# Altium footprint library ICs_imp.PCBLIB: 118 footprints (part 4 of 8)
Each footprint in its own frame and in the unit in brackets; x right, y up, seen from the top. Pads: shape width x height; smd on the part's side, far side on the other; paste and mask are expansions set on the pad; w line width, h text height; cw(c..) or ccw(c..) is an arc to the next point about the centre after c.
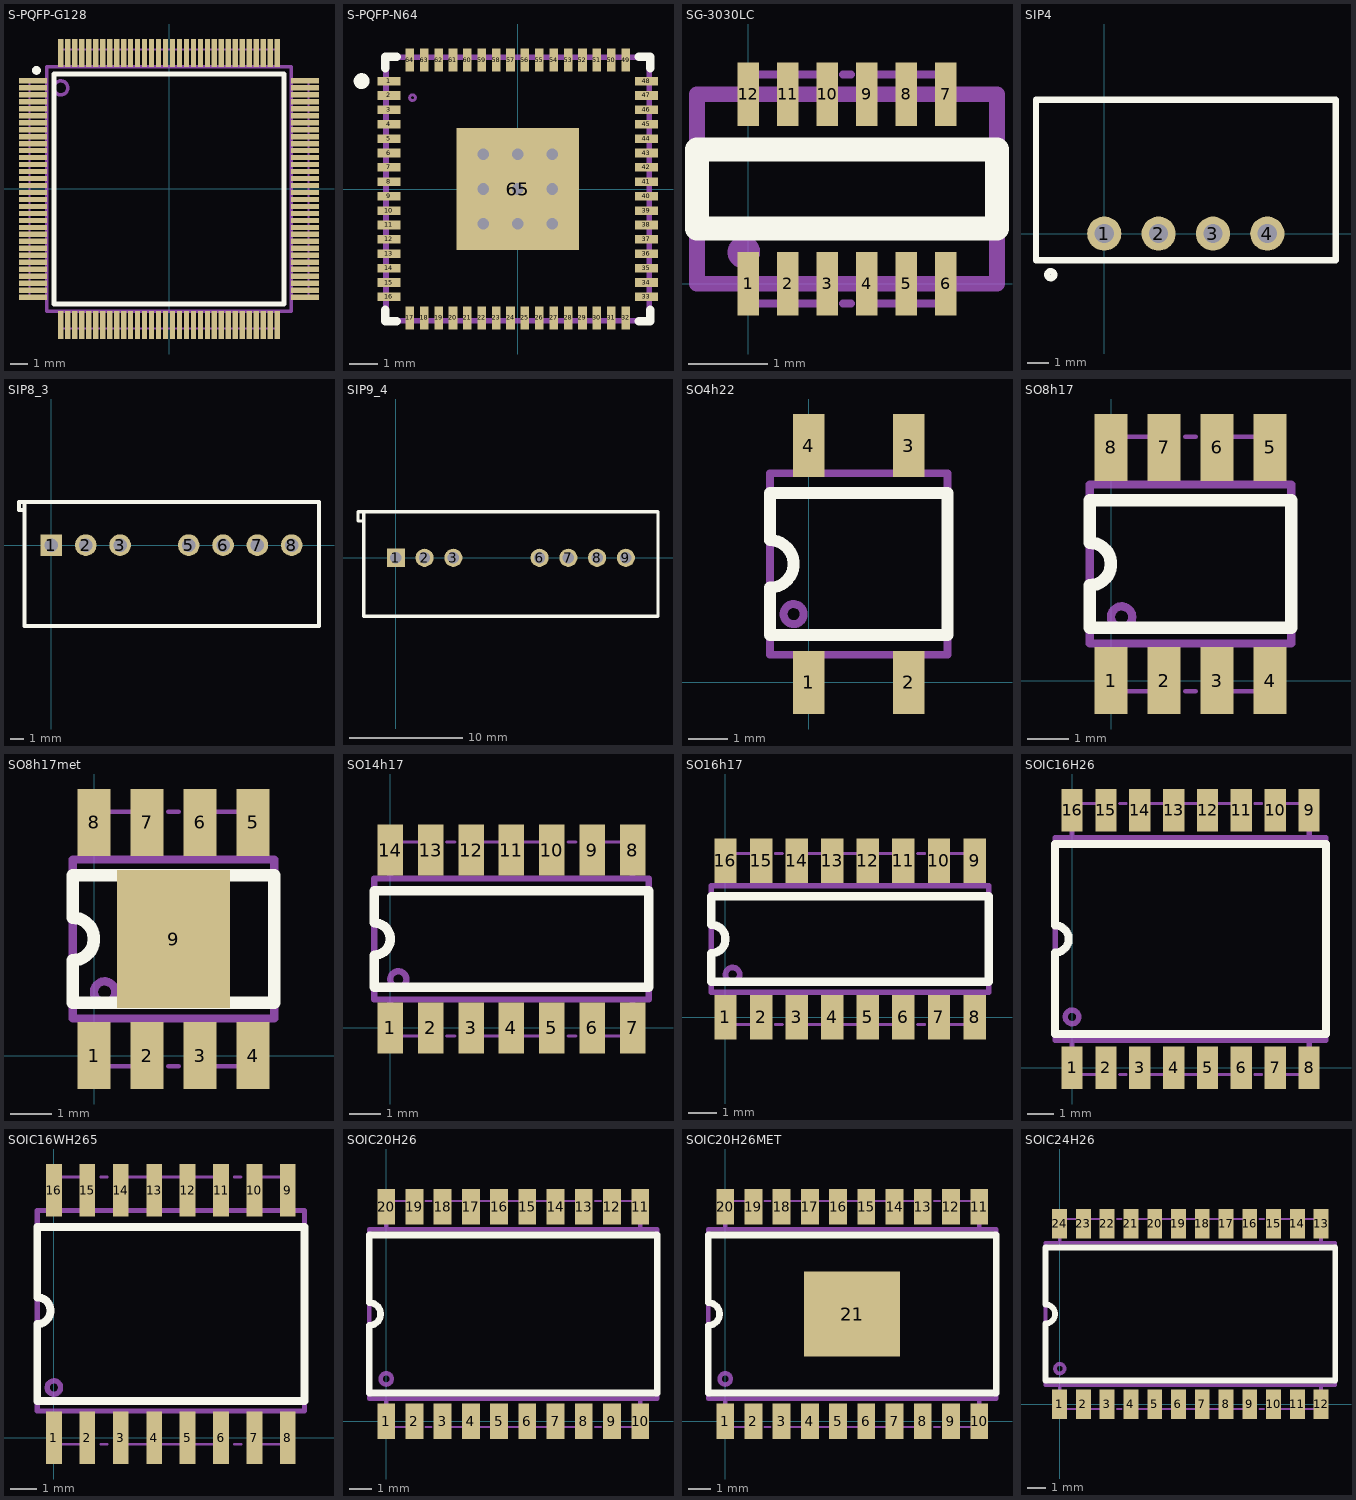
[diagram p3: the footprints below, top view; thin cyan lines are the x and y axes]

## S-PQFP-G128 [mm]
height 1.45
pads (128):
  rect 1.6x0.3 smd: 1(-7.8,6.2) 2(-7.8,5.8) 3(-7.8,5.4) 4(-7.8,5) 5(-7.8,4.6) 6(-7.8,4.2) 7(-7.8,3.8) 8(-7.8,3.4) 9(-7.8,3) 10(-7.8,2.6) 11(-7.8,2.2) 12(-7.8,1.8) 13(-7.8,1.4) 14(-7.8,1) 15(-7.8,0.6) 16(-7.8,0.2) 17(-7.8,-0.2) 18(-7.8,-0.6) 19(-7.8,-1) 20(-7.8,-1.4) 21(-7.8,-1.8) 22(-7.8,-2.2) 23(-7.8,-2.6) 24(-7.8,-3) 25(-7.8,-3.4) 26(-7.8,-3.8) 27(-7.8,-4.2) 28(-7.8,-4.6) 29(-7.8,-5) 30(-7.8,-5.4) 31(-7.8,-5.8) 32(-7.8,-6.2) 65(7.8,-6.2) 66(7.8,-5.8) 67(7.8,-5.4) 68(7.8,-5) 69(7.8,-4.6) 70(7.8,-4.2) 71(7.8,-3.8) 72(7.8,-3.4) 73(7.8,-3) 74(7.8,-2.6) 75(7.8,-2.2) 76(7.8,-1.8) 77(7.8,-1.4) 78(7.8,-1) 79(7.8,-0.6) 80(7.8,-0.2) 81(7.8,0.2) 82(7.8,0.6) 83(7.8,1) 84(7.8,1.4) 85(7.8,1.8) 86(7.8,2.2) 87(7.8,2.6) 88(7.8,3) 89(7.8,3.4) 90(7.8,3.8) 91(7.8,4.2) 92(7.8,4.6) 93(7.8,5) 94(7.8,5.4) 95(7.8,5.8) 96(7.8,6.2)
  rect 0.3x1.6 smd: 33(-6.2,-7.8) 34(-5.8,-7.8) 35(-5.4,-7.8) 36(-5,-7.8) 37(-4.6,-7.8) 38(-4.2,-7.8) 39(-3.8,-7.8) 40(-3.4,-7.8) 41(-3,-7.8) 42(-2.6,-7.8) 43(-2.2,-7.8) 44(-1.8,-7.8) 45(-1.4,-7.8) 46(-1,-7.8) 47(-0.6,-7.8) 48(-0.2,-7.8) 49(0.2,-7.8) 50(0.6,-7.8) 51(1,-7.8) 52(1.4,-7.8) 53(1.8,-7.8) 54(2.2,-7.8) 55(2.6,-7.8) 56(3,-7.8) 57(3.4,-7.8) 58(3.8,-7.8) 59(4.2,-7.8) 60(4.6,-7.8) 61(5,-7.8) 62(5.4,-7.8) 63(5.8,-7.8) 64(6.2,-7.8) 97(6.2,7.8) 98(5.8,7.8) 99(5.4,7.8) 100(5,7.8) 101(4.6,7.8) 102(4.2,7.8) 103(3.8,7.8) 104(3.4,7.8) 105(3,7.8) 106(2.6,7.8) 107(2.2,7.8) 108(1.8,7.8) 109(1.4,7.8) 110(1,7.8) 111(0.6,7.8) 112(0.2,7.8) 113(-0.2,7.8) 114(-0.6,7.8) 115(-1,7.8) 116(-1.4,7.8) 117(-1.8,7.8) 118(-2.2,7.8) 119(-2.6,7.8) 120(-3,7.8) 121(-3.4,7.8) 122(-3.8,7.8) 123(-4.2,7.8) 124(-4.6,7.8) 125(-5,7.8) 126(-5.4,7.8) 127(-5.8,7.8) 128(-6.2,7.8)
Top Overlay:
  circle w0.3: c-7.6,6.8 r0.1
  lines w0.3: -6.6,-6.6 6.6,-6.6 6.6,6.6 -6.6,6.6 -6.6,-6.6
Mechanical 1:
  circle w0.2: c-6.2,5.8 r0.4
  lines w0.1: -7,-6.2 -8,-6.2 -8,6.2 -7,6.2 ; -6.2,-7 -6.2,-8 6.2,-8 6.2,-7 ; -6.2,7 -6.2,8 6.2,8 6.2,7 ; 7,-6.2 8,-6.2 8,6.2 7,6.2
  lines w0.2: -7,-7 7,-7 7,7 -7,7 -7,-7
  text ".Designator" at -1.11,0.28 h1.5
  text ".Comment" at -2.7,-1.42 h1.5
  text "128" at -5.1,5.2 h1.5
3D body "S-PQFP-G128h1_45.stp": height 1.47, standoff 0, extent -8,-8 8,8

## S-PQFP-N64 [mm] "QFN, 64-Leads, Body 9.1x9.1mm (max), Pitch 0.50mm, IPC Medium Density"
height 1
pads (65):
  rect 0.8x0.3 smd: 1(-4.475,3.75) 2(-4.475,3.25) 3(-4.475,2.75) 4(-4.475,2.25) 5(-4.475,1.75) 6(-4.475,1.25) 7(-4.475,0.75) 8(-4.475,0.25) 9(-4.475,-0.25) 10(-4.475,-0.75) 11(-4.475,-1.25) 12(-4.475,-1.75) 13(-4.475,-2.25) 14(-4.475,-2.75) 15(-4.475,-3.25) 16(-4.475,-3.75) 33(4.475,-3.75) 34(4.475,-3.25) 35(4.475,-2.75) 36(4.475,-2.25) 37(4.475,-1.75) 38(4.475,-1.25) 39(4.475,-0.75) 40(4.475,-0.25) 41(4.475,0.25) 42(4.475,0.75) 43(4.475,1.25) 44(4.475,1.75) 45(4.475,2.25) 46(4.475,2.75) 47(4.475,3.25) 48(4.475,3.75)
  rect 0.3x0.8 smd: 17(-3.75,-4.475) 18(-3.25,-4.475) 19(-2.75,-4.475) 20(-2.25,-4.475) 21(-1.75,-4.475) 22(-1.25,-4.475) 23(-0.75,-4.475) 24(-0.25,-4.475) 25(0.25,-4.475) 26(0.75,-4.475) 27(1.25,-4.475) 28(1.75,-4.475) 29(2.25,-4.475) 30(2.75,-4.475) 31(3.25,-4.475) 32(3.75,-4.475) 49(3.75,4.475) 50(3.25,4.475) 51(2.75,4.475) 52(2.25,4.475) 53(1.75,4.475) 54(1.25,4.475) 55(0.75,4.475) 56(0.25,4.475) 57(-0.25,4.475) 58(-0.75,4.475) 59(-1.25,4.475) 60(-1.75,4.475) 61(-2.25,4.475) 62(-2.75,4.475) 63(-3.25,4.475) 64(-3.75,4.475)
  rect 4.25x4.25 smd: 65(0,0)
via 1.2,-1.2 diameter 0.8 hole 0.4
via 0,-1.2 diameter 0.8 hole 0.4
via -1.2,-1.2 diameter 0.8 hole 0.4
via 1.2,0 diameter 0.8 hole 0.4
via 0,0 diameter 0.8 hole 0.4
via -1.2,0 diameter 0.8 hole 0.4
via 1.2,1.2 diameter 0.8 hole 0.4
via 0,1.2 diameter 0.8 hole 0.4
via -1.2,1.2 diameter 0.8 hole 0.4
Top Overlay:
  circle w0.3: c-5.425,3.75 r0.125
  lines w0.3: -4.6,-4.2 -4.6,-4.6 -4.2,-4.6 ; -4.6,4.2 -4.6,4.6 -4.2,4.6 ; 4.2,-4.6 4.6,-4.6 4.6,-4.2 ; 4.2,4.6 4.6,4.6 4.6,4.2
Mechanical 1:
  circle w0.1: c-3.656,3.175 r0.1
  lines w0.2: -4.575,-4.575 4.575,-4.575 4.575,4.575 -4.575,4.575 -4.575,-4.575
  text "64" at -3.429,3.429 h1.5
  text ".Comment" at -2.88,-1.15 h1.5
  text ".Designator" at -1.29,0.55 h1.5
3D body "S-PQFP-N64.stp": height 1, standoff 0, extent -4.575,-4.575 4.575,4.575

## SG-3030LC [mm]
pads (12):
  rect 0.27x0.8 smd: 1(0,0) 2(0.5,0) 3(1,0) 4(1.5,0) 5(2,0) 6(2.5,0) 7(2.5,2.4) 8(2,2.4) 9(1.5,2.4) 10(1,2.4) 11(0.5,2.4) 12(0,2.4)
Top Overlay:
  lines w0.3: -0.65,0.7 -0.65,1.7 3.15,1.7 3.15,0.7 -0.65,0.7
Mechanical 1:
  circle w0.2: c-0.057,0.4 r0.107
  lines w0.1: 0,-0.25 0.85,-0.25 ; 0,2.65 0.85,2.65 ; 1.2,-0.25 1.3,-0.25 ; 1.2,2.65 1.3,2.65 ; 1.65,-0.25 2.5,-0.25 ; 1.65,2.65 2.5,2.65
  lines w0.2: 0,-0.25 0,0 -0.65,0 ; 0,2.4 0,2.65 ; 2.5,-0.25 2.5,0 ; 2.5,2.4 2.5,2.65 ; -0.65,0 -0.65,2.4 3.15,2.4 3.15,0 -0.65,0
  text ".Designator" at 0.69,0.35 h1.5
  text ".Comment" at -1.61,-1.43 h1.5
  text "12" at -0.35,1.2 h1.5
3D body "SG-3030LC.stp": height 1.21, standoff 0, extent -0.65,-0.3 3.15,2.7

## SIP4 [mm]
height 10
pads (4):
  round 1.6 hole 0.9: 1(0,0) 2(2.54,0) 3(5.08,0) 4(7.62,0)
Top Overlay:
  lines w0.3: -2.345,-1.959 cw(c-2.5,-1.92) -2.34,-1.92 ; -3.19,-1.25 10.82,-1.25 10.82,6.25 -3.19,6.25 -3.19,-1.25
Mechanical 1:
  lines w0.2: -3.19,-1.25 -3.19,6.25 10.81,6.25 10.81,-1.25 -3.19,-1.25 ; -3.17,-1.25 -3.17,6.25 10.83,6.25 10.83,-1.25 -3.17,-1.25
  lines w0.25: 0.203,0.078 ccw(c0.011,-0.006) 0.21,0.06
  text ".Designator" at 1.89,4.08 h1.5
  text ".Comment" at 0.3,2.38 h1.5
3D body "SIP4.stp": height 10, standoff -3, extent -3.175,-1.25 10.825,6.25

## SIP8_3 [mm]
height 11.1
pads (7):
  rect 1.6x1.6 hole 1: 1(0,0)
  round 1.6 hole 1: 2(2.54,0) 3(5.08,0) 5(10.16,0) 6(12.7,0) 7(15.24,0) 8(17.78,0)
Top Overlay:
  lines w0.3: -2,2.6 -2.4,2.6 -2.4,3.2 -2,3.2 ; -2,3.2 19.8,3.2 19.8,-6 -2,-6 -2,3.2
Mechanical 1:
  lines w0.2: -2,-6 19.8,-6 19.8,3.2 -2,3.2 -2,-6
  lines w0.25: 0.203,0.078 ccw(c0.011,-0.006) 0.21,0.06
  text ".Designator" at 8.04,-2.4 h1.5
  text ".Comment" at 6.45,-4.1 h1.5
  text "8" at 17.8,-0.4 h1.5
  text "1" at -0.2,-0.4 h1.5
3D body "SIP8.stp": height 11.1, standoff -3, extent -2,-6 19.8,3.2

## SIP9_4 [mm]
height 12.45
pads (7):
  rect 1.6x1.6 hole 1: 1(0,0)
  round 1.6 hole 1: 2(2.54,0) 3(5.08,0) 6(12.7,0) 7(15.24,0) 8(17.78,0) 9(20.32,0)
Top Overlay:
  lines w0.3: -2.84,3.25 -3.34,3.25 -3.34,4.05 -2.84,4.05 ; -2.84,4.05 -2.84,-5.15 23.16,-5.15 23.16,4.05 -2.84,4.05
Mechanical 1:
  lines w0.2: -2.84,-5.15 -2.84,4.05 23.16,4.05 23.16,-5.15 -2.84,-5.15
  lines w0.25: 0.203,0.078 ccw(c0.011,-0.006) 0.21,0.06
  text "1" at -0.2,-0.4 h1.5
  text "8" at 20.34,-0.4 h1.5
  text ".Comment" at 7.64,-3.74 h1.5
  text ".Designator" at 9.23,-2.04 h1.5
3D body "SIP9_4.stp": height 12.45, standoff -3, extent -2.84,-5.15 23.16,4.05

## SO4h22 [mm]
height 2.2
pads (4):
  rect 0.8x1.6 smd: 1(0,0) 2(2.54,0) 3(2.54,6) 4(0,6)
Top Overlay:
  lines w0.3: -0.98,2.402 ccw(c-0.98,3.001) -0.98,3.6 -0.98,4.8 3.52,4.8 3.52,1.2 -0.98,1.2 -0.98,2.405
Mechanical 1:
  circle w0.2: c-0.381,1.73 r0.254
  lines w0.2: 0,-0.375 0,0.7 ; 0,5.3 0,6.375 ; 2.54,-0.375 2.54,0.7 ; 2.54,5.3 2.54,6.375 ; -0.98,0.7 -0.98,5.3 3.52,5.3 3.52,0.7 -0.98,0.7
  text ".Designator" at 0.34,2.26 h1.5
  text ".Comment" at -1.51,-1.79 h1.5
  text "4" at -0.485,3.656 h1.5
3D body "SO4h22.stp": height 2.21, standoff 0, extent -0.975,-0.4 3.525,6.4

## SO8h17 [mm]
height 1.7
pads (8):
  rect 0.8x1.6 smd: 1(0,0) 2(1.27,0) 3(2.54,0) 4(3.81,0) 5(3.81,5.588) 6(2.54,5.588) 7(1.27,5.588) 8(0,5.588)
Top Overlay:
  lines w0.3: -0.508,1.27 4.318,1.27 4.318,4.318 -0.508,4.318 -0.508,3.302 cw(c-0.508,2.794) -0.508,2.286 -0.508,1.27
Mechanical 1:
  circle w0.2: c0.254,1.524 r0.254
  lines w0.1: 0,-0.254 1.27,-0.254 ; 0,5.842 1.27,5.842 ; 1.778,-0.254 2.032,-0.254 ; 1.778,5.842 2.032,5.842 ; 2.54,-0.254 3.81,-0.254 ; 2.54,5.842 3.81,5.842
  lines w0.2: 0,-0.254 0,0.762 ; 0,4.826 0,5.842 ; 3.81,-0.254 3.81,0.762 ; 3.81,4.826 3.81,5.842 ; -0.508,0.889 4.318,0.889 4.318,4.699 -0.508,4.699 -0.508,0.889
  text ".Designator" at 0.84,2.23 h1.5
  text ".Comment" at -0.98,-1.79 h1.5
  text "8" at 0.15,3.45 h1.5
3D body "SO8h17.stp": height 1.71, standoff 0, extent -0.6,-0.35 4.4,5.95

## SO8h17met [mm]
height 1.7
pads (9):
  rect 0.8x1.6 smd: 1(0,0) 2(1.27,0) 3(2.54,0) 4(3.81,0) 5(3.81,5.588) 6(2.54,5.588) 7(1.27,5.588) 8(0,5.588)
  rect 2.7x3.3 smd: 9(1.905,2.794)
Top Overlay:
  lines w0.3: -0.508,1.27 -0.508,2.286 ccw(c-0.508,2.794) -0.508,3.302 -0.508,4.318 4.318,4.318 4.318,1.27 -0.508,1.27
Mechanical 1:
  circle w0.2: c0.254,1.524 r0.254
  lines w0.1: 0,-0.254 1.27,-0.254 ; 0,5.842 1.27,5.842 ; 1.778,-0.254 2.032,-0.254 ; 1.778,5.842 2.032,5.842 ; 2.54,-0.254 3.81,-0.254 ; 2.54,5.842 3.81,5.842
  lines w0.2: 0,-0.254 0,0.762 ; 0,4.826 0,5.842 ; 3.81,-0.254 3.81,0.762 ; 3.81,4.826 3.81,5.842 ; -0.508,0.889 -0.508,4.699 4.318,4.699 4.318,0.889 -0.508,0.889
  text "8" at 0.15,3.45 h1.5
  text ".Comment" at -1.08,-1.6 h1.5
  text ".Designator" at 0.78,2.04 h1.5
3D body "SO8h17.stp": height 1.71, standoff 0, extent -0.6,-0.35 4.4,5.95

## SO14h17 [mm]
height 1.7
pads (14):
  rect 0.8x1.6 smd: 1(0,0) 2(1.27,0) 3(2.54,0) 4(3.81,0) 5(5.08,0) 6(6.35,0) 7(7.62,0) 8(7.62,5.588) 9(6.35,5.588) 10(5.08,5.588) 11(3.81,5.588) 12(2.54,5.588) 13(1.27,5.588) 14(0,5.588)
Top Overlay:
  lines w0.3: -0.508,1.27 8.128,1.27 8.128,4.318 -0.508,4.318 -0.508,3.302 cw(c-0.508,2.794) -0.508,2.286 -0.508,1.27
Mechanical 1:
  circle w0.2: c0.254,1.524 r0.254
  lines w0.1: 0,-0.254 1.27,-0.254 ; 0,5.842 1.27,5.842 ; 1.778,-0.254 2.032,-0.254 ; 1.778,5.842 2.032,5.842 ; 2.54,-0.254 5.08,-0.254 ; 2.54,5.842 5.08,5.842 ; 5.588,-0.254 5.842,-0.254 ; 5.588,5.842 5.842,5.842 ; 6.35,-0.254 7.62,-0.254 ; 6.35,5.842 7.62,5.842
  lines w0.2: 0,-0.254 0,0.762 ; 0,4.826 0,5.842 ; 7.62,-0.254 7.62,0.762 ; 7.62,4.826 7.62,5.842 ; -0.508,0.889 8.128,0.889 8.128,4.699 -0.508,4.699 -0.508,0.889
  text ".Designator" at 2.05,3.48 h1.5
  text ".Comment" at 0.97,2.06 h1.5
  text "14" at 0.01,3.4 h1.5
3D body "SO14h17.stp": height 1.71, standoff 0, extent -0.6,-0.35 8.21,5.95

## SO16h17 [mm]
height 1.7
pads (16):
  rect 0.8x1.6 smd: 1(0,0) 2(1.27,0) 3(2.54,0) 4(3.81,0) 5(5.08,0) 6(6.35,0) 7(7.62,0) 8(8.89,0) 9(8.89,5.588) 10(7.62,5.588) 11(6.35,5.588) 12(5.08,5.588) 13(3.81,5.588) 14(2.54,5.588) 15(1.27,5.588) 16(0,5.588)
Top Overlay:
  lines w0.3: -0.508,1.27 9.398,1.27 9.398,4.318 -0.508,4.318 -0.508,3.302 cw(c-0.508,2.794) -0.508,2.286 -0.508,1.27
Mechanical 1:
  circle w0.2: c0.254,1.524 r0.254
  lines w0.1: 0,-0.254 1.27,-0.254 ; 0,5.842 1.27,5.842 ; 1.778,-0.254 2.032,-0.254 ; 1.778,5.842 2.032,5.842 ; 2.54,-0.254 6.35,-0.254 ; 2.54,5.842 6.35,5.842 ; 6.858,-0.254 7.112,-0.254 ; 6.858,5.842 7.112,5.842 ; 7.62,-0.254 8.89,-0.254 ; 7.62,5.842 8.89,5.842
  lines w0.2: 0,-0.254 0,0.762 ; 0,4.826 0,5.842 ; 8.89,-0.254 8.89,0.762 ; 8.89,4.826 8.89,5.842 ; -0.508,0.889 9.398,0.889 9.398,4.699 -0.508,4.699 -0.508,0.889
  text ".Comment" at 1.47,1.76 h1.5
  text ".Designator" at 2.55,3.18 h1.5
  text "16" at -0.127,3.556 h1.5
3D body "SO16h17.stp": height 1.71, standoff 0, extent -0.595,-0.356 9.485,5.944

## SOIC16H26 [mm]
height 2.6
pads (16):
  rect 0.8x1.6 smd: 1(0,0) 2(1.27,0) 3(2.54,0) 4(3.81,0) 5(5.08,0) 6(6.35,0) 7(7.62,0) 8(8.89,0) 9(8.89,9.652) 10(7.62,9.652) 11(6.35,9.652) 12(5.08,9.652) 13(3.81,9.652) 14(2.54,9.652) 15(1.27,9.652) 16(0,9.652)
Top Overlay:
  lines w0.3: -0.635,1.27 -0.635,4.318 ccw(c-0.635,4.826) -0.635,5.334 -0.635,8.382 9.525,8.382 9.525,1.27 -0.635,1.27
Mechanical 1:
  circle w0.2: c0,1.905 r0.254
  lines w0.1: 0,-0.254 1.27,-0.254 ; 0,9.906 1.27,9.906 ; 1.778,-0.254 2.032,-0.254 ; 1.778,9.906 2.032,9.906 ; 2.54,-0.254 6.35,-0.254 ; 2.54,9.906 6.35,9.906 ; 6.858,-0.254 7.112,-0.254 ; 6.858,9.906 7.112,9.906 ; 7.62,-0.254 8.89,-0.254 ; 7.62,9.906 8.89,9.906
  lines w0.2: 0,-0.254 0,1.016 ; 0,8.636 0,9.906 ; 8.89,-0.254 8.89,1.016 ; 8.89,8.636 8.89,9.906 ; -0.635,1.016 -0.635,8.636 9.525,8.636 9.525,1.016 -0.635,1.016
  text "16" at 0,7 h1.5
  text ".Comment" at 1.19,3.58 h1.5
  text ".Designator" at 2.78,5.28 h1.5
3D body "SOIC16h26.stp": height 2.61, standoff 0, extent -0.8,-0.5 9.7,10.15

## SOIC16WH265 [mm]
height 2.65
pads (16):
  rect 0.6x2 smd: 1(0,0) 2(1.27,0) 3(2.54,0) 4(3.81,0) 5(5.08,0) 6(6.35,0) 7(7.62,0) 8(8.89,0) 9(8.89,9.4) 10(7.62,9.4) 11(6.35,9.4) 12(5.08,9.4) 13(3.81,9.4) 14(2.54,9.4) 15(1.27,9.4) 16(0,9.4)
Top Overlay:
  lines w0.3: -0.635,1.4 9.525,1.4 9.525,8 -0.635,8 -0.635,5.334 cw(c-0.635,4.826) -0.635,4.318 -0.635,1.4
Mechanical 1:
  circle w0.2: c0,1.905 r0.254
  lines w0.1: 0,-0.254 1.27,-0.254 ; 0,9.906 1.27,9.906 ; 1.778,-0.254 2.032,-0.254 ; 1.778,9.906 2.032,9.906 ; 2.54,-0.254 6.35,-0.254 ; 2.54,9.906 6.35,9.906 ; 6.858,-0.254 7.112,-0.254 ; 6.858,9.906 7.112,9.906 ; 7.62,-0.254 8.89,-0.254 ; 7.62,9.906 8.89,9.906
  lines w0.2: 0,-0.254 0,1.016 ; 0,8.636 0,9.906 ; 8.89,-0.254 8.89,1.016 ; 8.89,8.636 8.89,9.906 ; -0.635,1.016 9.525,1.016 9.525,8.636 -0.635,8.636 -0.635,1.016
  text ".Designator" at 2.78,5.28 h1.5
  text ".Comment" at 1.19,3.58 h1.5
  text "16" at 0,7 h1.5
3D body "SOIC16h26.stp": height 2.61, standoff 0, extent -0.8,-0.5 9.7,10.15

## SOIC20H26 [mm]
height 2.6
pads (20):
  rect 0.8x1.6 smd: 1(0,0) 2(1.27,0) 3(2.54,0) 4(3.81,0) 5(5.08,0) 6(6.35,0) 7(7.62,0) 8(8.89,0) 9(10.16,0) 10(11.43,0) 11(11.43,9.652) 12(10.16,9.652) 13(8.89,9.652) 14(7.62,9.652) 15(6.35,9.652) 16(5.08,9.652) 17(3.81,9.652) 18(2.54,9.652) 19(1.27,9.652) 20(0,9.652)
Top Overlay:
  lines w0.3: -0.76,1.27 12.19,1.27 12.19,8.382 -0.76,8.382 -0.76,5.334 cw(c-0.76,4.826) -0.76,4.318 -0.76,1.27
Mechanical 1:
  circle w0.2: c0,1.905 r0.254
  lines w0.1: 0,-0.254 1.27,-0.254 ; 0,9.906 1.27,9.906 ; 1.778,-0.254 2.032,-0.254 ; 1.778,9.906 2.032,9.906 ; 2.54,-0.254 8.89,-0.254 ; 2.54,9.906 8.89,9.906 ; 9.398,-0.254 9.652,-0.254 ; 9.398,9.906 9.652,9.906 ; 10.16,-0.254 11.43,-0.254 ; 10.16,9.906 11.43,9.906
  lines w0.2: 0,-0.254 0,1.016 ; 0,8.636 0,9.906 ; 11.43,-0.254 11.43,1.016 ; 11.43,8.636 11.43,9.906 ; -0.76,1.016 12.19,1.016 12.19,8.636 -0.76,8.636 -0.76,1.016
  text ".Designator" at 4.455,5.28 h1.5
  text ".Comment" at 2.865,3.58 h1.5
  text "20" at 0,7 h1.5
3D body "SOIC20h26.stp": height 2.61, standoff 0, extent -0.76,-0.499 12.19,10.151

## SOIC20H26MET [mm]
height 2.6
pads (21):
  rect 0.8x1.6 smd: 1(0,0) 2(1.27,0) 3(2.54,0) 4(3.81,0) 5(5.08,0) 6(6.35,0) 7(7.62,0) 8(8.89,0) 9(10.16,0) 10(11.43,0) 11(11.43,9.652) 12(10.16,9.652) 13(8.89,9.652) 14(7.62,9.652) 15(6.35,9.652) 16(5.08,9.652) 17(3.81,9.652) 18(2.54,9.652) 19(1.27,9.652) 20(0,9.652)
  rect 4.32x3.81 smd: 21(5.715,4.826)
Top Overlay:
  lines w0.3: -0.76,1.27 12.19,1.27 12.19,8.382 -0.76,8.382 -0.76,5.334 cw(c-0.76,4.826) -0.76,4.318 -0.76,1.27
Mechanical 1:
  circle w0.2: c0,1.905 r0.254
  lines w0.1: 0,-0.254 1.27,-0.254 ; 0,9.906 1.27,9.906 ; 1.778,-0.254 2.032,-0.254 ; 1.778,9.906 2.032,9.906 ; 2.54,-0.254 8.89,-0.254 ; 2.54,9.906 8.89,9.906 ; 9.398,-0.254 9.652,-0.254 ; 9.398,9.906 9.652,9.906 ; 10.16,-0.254 11.43,-0.254 ; 10.16,9.906 11.43,9.906
  lines w0.2: 0,-0.254 0,1.016 ; 0,8.636 0,9.906 ; 11.43,-0.254 11.43,1.016 ; 11.43,8.636 11.43,9.906 ; -0.76,1.016 12.19,1.016 12.19,8.636 -0.76,8.636 -0.76,1.016
  text ".Designator" at 4.455,5.28 h1.5
  text ".Comment" at 2.865,3.58 h1.5
  text "20" at 0,7 h1.5
3D body "SOIC20h26.stp": height 2.61, standoff 0, extent -0.76,-0.499 12.19,10.151

## SOIC24H26 [mm]
height 2.6
pads (24):
  rect 0.8x1.6 smd: 1(0,0) 2(1.27,0) 3(2.54,0) 4(3.81,0) 5(5.08,0) 6(6.35,0) 7(7.62,0) 8(8.89,0) 9(10.16,0) 10(11.43,0) 11(12.7,0) 12(13.97,0) 13(13.97,9.652) 14(12.7,9.652) 15(11.43,9.652) 16(10.16,9.652) 17(8.89,9.652) 18(7.62,9.652) 19(6.35,9.652) 20(5.08,9.652) 21(3.81,9.652) 22(2.54,9.652) 23(1.27,9.652) 24(0,9.652)
Top Overlay:
  lines w0.3: -0.76,1.27 -0.76,4.318 ccw(c-0.76,4.826) -0.76,5.334 -0.76,8.382 14.73,8.382 14.73,1.27 -0.76,1.27
Mechanical 1:
  circle w0.2: c0,1.905 r0.254
  lines w0.1: 0,-0.254 2.54,-0.254 ; 0,9.906 2.54,9.906 ; 3.048,-0.254 3.302,-0.254 ; 3.048,9.906 3.302,9.906 ; 3.81,-0.254 10.16,-0.254 ; 3.81,9.906 10.16,9.906 ; 10.668,-0.254 10.922,-0.254 ; 10.668,9.906 10.922,9.906 ; 11.43,-0.254 13.97,-0.254 ; 11.43,9.906 13.97,9.906
  lines w0.2: 0,-0.254 0,1.016 ; 0,8.636 0,9.906 ; 13.97,-0.254 13.97,1.016 ; 13.97,8.636 13.97,9.906 ; -0.76,1.016 -0.76,8.636 14.73,8.636 14.73,1.016 -0.76,1.016
  text "24" at 0,7 h1.5
  text ".Comment" at 3.88,3.605 h1.5
  text ".Designator" at 5.85,5.311 h1.5
3D body "SOIC24h26.stp": height 2.61, standoff 0, extent -0.76,-0.499 14.73,10.151